# Altium footprint library 封装库.PcbLib: 755 footprints (part 35 of 48)
Each footprint in its own frame and in the unit in brackets; x right, y up, seen from the top. Pads: shape width x height; smd on the part's side, far side on the other; paste and mask are expansions set on the pad; w line width, h text height; cw(c..) or ccw(c..) is an arc to the next point about the centre after c.
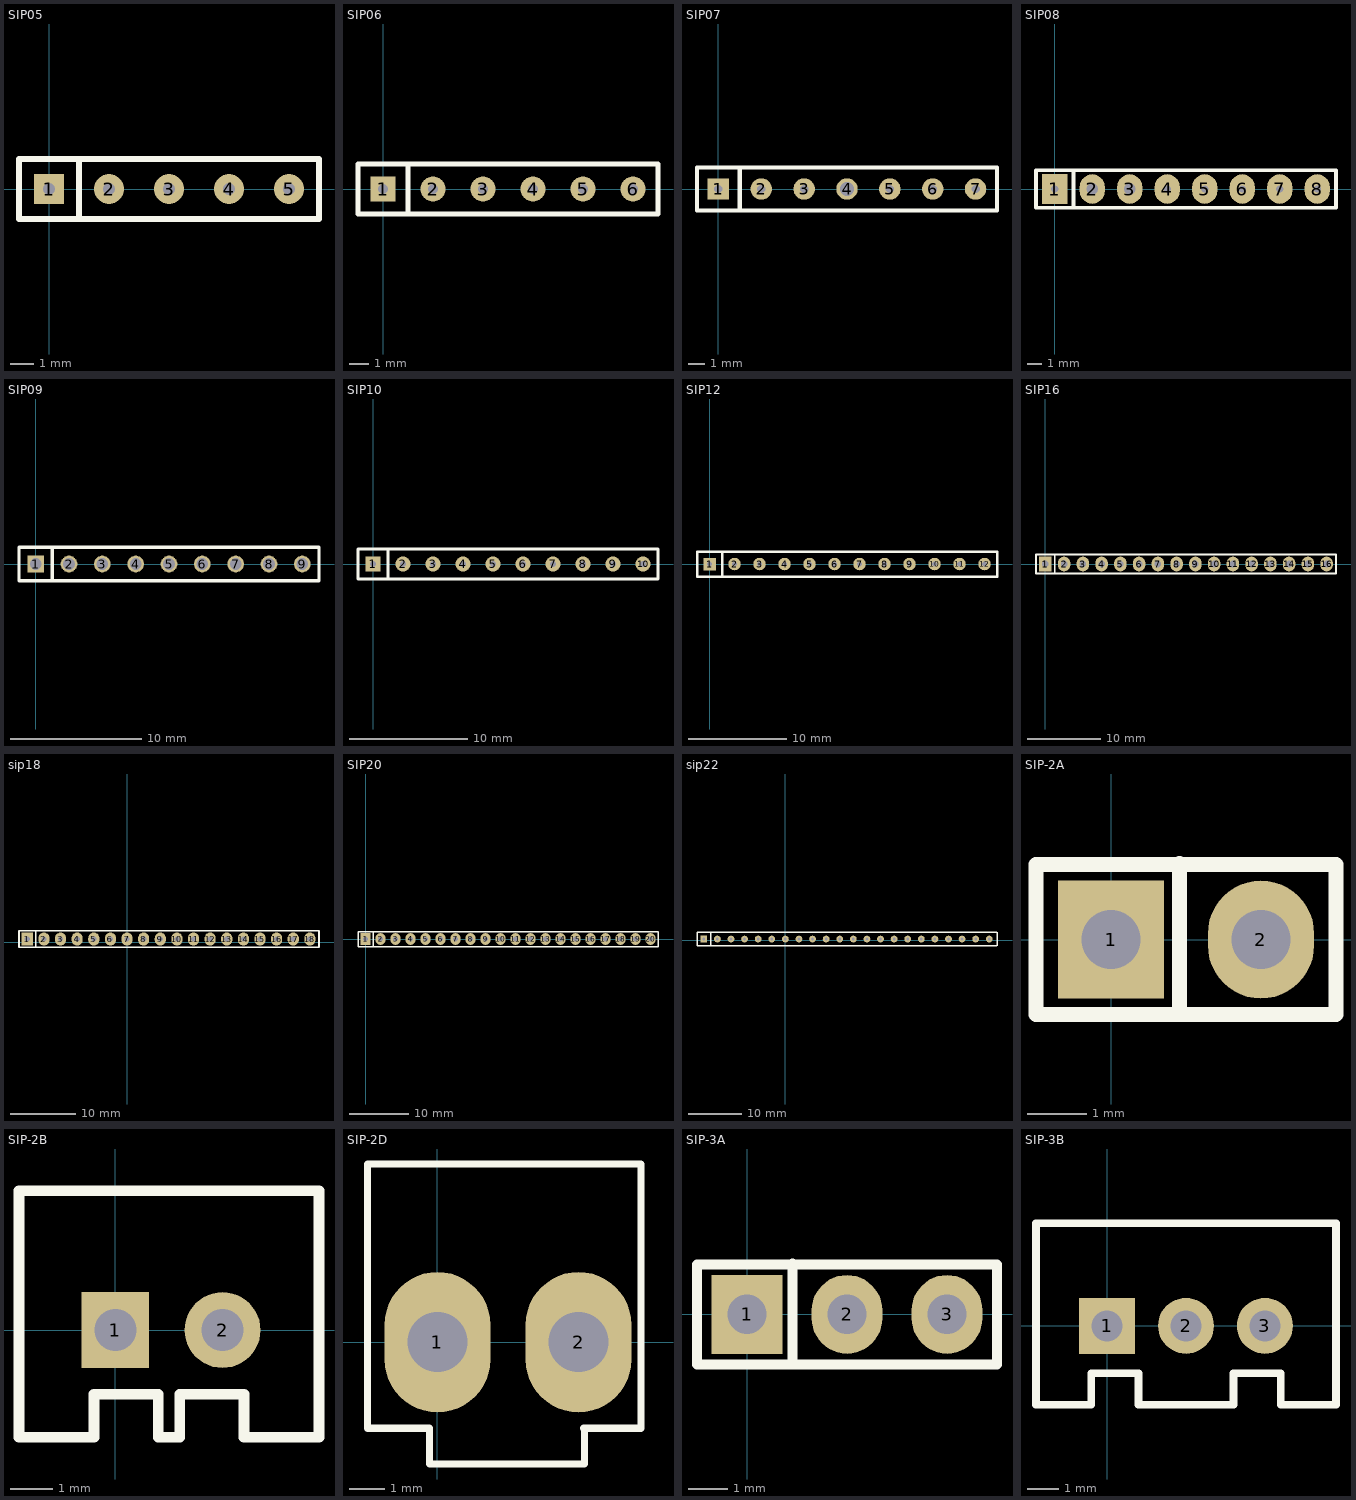
[diagram p34: the footprints below, top view; thin cyan lines are the x and y axes]

## SIP05 [mm]
pads (5):
  rect 1.27x1.27 hole 0.5: 1(0,0)
  round 1.27 hole 0.5: 2(2.54,0) 3(5.08,0) 4(7.62,0) 5(10.16,0)
Top Overlay:
  lines w0.254: 1.27,-1.27 1.27,1.27 ; -1.27,-1.27 -1.27,1.27 11.43,1.27 11.43,-1.27 -1.27,-1.27

## SIP06 [mm]
pads (6):
  rect 1.27x1.27 hole 0.5: 1(0,0)
  round 1.27 hole 0.5: 2(2.54,0) 3(5.08,0) 4(7.62,0) 5(10.16,0) 6(12.7,0)
Top Overlay:
  lines w0.254: 1.27,-1.27 1.27,1.27 ; -1.27,-1.27 -1.27,1.27 13.97,1.27 13.97,-1.27 -1.27,-1.27

## SIP07 [mm]
pads (7):
  rect 1.27x1.27 hole 0.5: 1(0,0)
  round 1.27 hole 0.5: 2(2.54,0) 3(5.08,0) 5(10.16,0) 6(12.7,0) 7(15.24,0)
  round 1.27 hole 0.813: 4(7.62,0)
Top Overlay:
  lines w0.254: 1.27,-1.27 1.27,1.27 ; -1.27,-1.27 -1.27,1.27 16.51,1.27 16.51,-1.27 -1.27,-1.27

## SIP08 [mm]
pads (8):
  rect 1.7x2 hole 0.5: 1(0,0)
  oval 1.7x2 hole 0.8: 2(2.54,0) 3(5.08,0)
  oval 1.7x2 hole 0.5: 4(7.62,0) 5(10.16,0) 6(12.7,0) 7(15.24,0) 8(17.78,0)
Top Overlay:
  lines w0.254: 1.27,-1.27 1.27,1.27 ; -1.27,-1.27 19.05,-1.27 19.05,1.27 -1.27,1.27 -1.27,-1.27

## SIP09 [mm]
pads (9):
  rect 1.27x1.27 hole 0.9: 1(0,0)
  round 1.27 hole 0.9: 2(2.54,0) 3(5.08,0) 4(7.62,0) 5(10.16,0) 6(12.7,0) 7(15.24,0) 8(17.78,0) 9(20.32,0)
Top Overlay:
  lines w0.254: 1.27,-1.27 1.27,1.27 ; -1.27,-1.27 -1.27,1.27 21.59,1.27 21.59,-1.27 -1.27,-1.27

## SIP10 [mm]
pads (10):
  rect 1.27x1.27 hole 0.5: 1(0,0)
  round 1.27 hole 0.5: 2(2.54,0) 3(5.08,0) 4(7.62,0) 5(10.16,0) 6(12.7,0) 7(15.24,0) 8(17.78,0) 9(20.32,0) 10(22.86,0)
Top Overlay:
  lines w0.254: 1.27,-1.27 1.27,1.27 ; -1.27,-1.27 -1.27,1.27 24.13,1.27 24.13,-1.27 -1.27,-1.27

## SIP12 [mm]
pads (12):
  rect 1.27x1.27 hole 0.5: 1(0,0)
  round 1.27 hole 0.5: 2(2.54,0) 3(5.08,0) 4(7.62,0) 5(10.16,0) 6(12.7,0) 7(15.24,0) 8(17.78,0) 9(20.32,0) 10(22.86,0) 11(25.4,0) 12(27.94,0)
Top Overlay:
  lines w0.254: 1.27,-1.27 1.27,1.27 ; -1.27,-1.27 29.21,-1.27 29.21,1.27 -1.27,1.27 -1.27,-1.27

## SIP16 [mm]
pads (16):
  rect 1.7x2 hole 0.9: 1(0,0)
  oval 1.7x2 hole 0.9: 2(2.54,0) 3(5.08,0) 4(7.62,0) 5(10.16,0) 6(12.7,0) 7(15.24,0) 8(17.78,0) 9(20.32,0) 10(22.86,0) 11(25.4,0) 12(27.94,0) 13(30.48,0) 14(33.02,0) 15(35.56,0) 16(38.1,0)
Top Overlay:
  lines w0.254: 1.27,-1.27 1.27,1.27 ; -1.27,-1.27 -1.27,1.27 39.37,1.27 39.37,-1.27 -1.27,-1.27

## sip18 [mm]
pads (18):
  rect 1.7x2 hole 0.8: 1(-15.24,0.508)
  oval 1.7x2 hole 0.8: 2(-12.7,0.508) 3(-10.16,0.508) 4(-7.62,0.508) 5(-5.08,0.508) 6(-2.54,0.508) 7(0,0.508) 8(2.54,0.508) 9(5.08,0.508) 10(7.62,0.508) 11(10.16,0.508) 12(12.7,0.508) 13(15.24,0.508) 14(17.78,0.508) 15(20.32,0.508) 16(22.86,0.508) 17(25.4,0.508) 18(27.94,0.508)
Top Overlay:
  lines w0.254: -13.97,-0.762 -13.97,1.778 ; 29.337,-0.762 -16.51,-0.762 -16.51,1.778 -16.485,1.803 29.337,1.803 29.337,-0.737

## SIP20 [mm]
pads (20):
  rect 1.7x2 hole 0.9: 1(0,0)
  oval 1.7x2 hole 0.9: 2(2.54,0) 3(5.08,0) 4(7.62,0) 5(10.16,0) 6(12.7,0) 7(15.24,0) 8(17.78,0) 9(20.32,0) 10(22.86,0) 11(25.4,0) 12(27.94,0) 13(30.48,0) 14(33.02,0) 15(35.56,0) 16(38.1,0) 17(40.64,0) 18(43.18,0) 19(45.72,0) 20(48.26,0)
Top Overlay:
  lines w0.254: 1.27,-1.27 1.27,1.27 ; -1.27,-1.27 -1.27,1.27 49.53,1.27 49.53,-1.27 -1.27,-1.27

## sip22 [mil]
pads (22):
  rect 50x50 hole 19.68: 1(-598,8)
  round 50 hole 19.68: 2(-498,8) 3(-398,8) 4(-298,8) 5(-198,8) 6(-98,8) 7(2,8) 8(102,8) 9(202,8) 10(302,8) 11(402,8) 12(502,8) 13(602,8) 14(702,8) 15(802,8) 16(902,8) 17(1002,8) 18(1102,8) 19(1202,8) 20(1302,8) 21(1402,8) 22(1502,8)
Top Overlay:
  lines w10: -548,-42 -548,58 ; 1558,-42 1352,-42 -648,-42 -648,58 1352,58 1558,58 ; 1559,-41 1559,59

## SIP-2A [mm]
pads (2):
  rect 1.8x2 hole 1: 1(0,0)
  oval 1.8x2 hole 1: 2(2.54,0)
Top Overlay:
  lines w0.254: 1.16,-1.25 1.16,1.29 ; -1.27,-1.27 3.81,-1.27 3.81,1.27 -1.27,1.27 -1.27,-1.27

## SIP-2B [mm]
pads (2):
  rect 1.6x1.8 hole 1: 1(0,0)
  round 1.8 hole 1: 2(2.54,0)
Top Overlay:
  lines w0.254: -2.286,-2.54 -0.508,-2.54 -0.508,-1.524 1.016,-1.524 1.016,-2.54 1.524,-2.54 1.524,-1.524 3.048,-1.524 3.048,-2.54 4.826,-2.54 4.826,3.302 -2.286,3.302 -2.286,-2.54

## SIP-2D [mil]
pads (2):
  oval 118x157 hole 67: 1(0,0) 2(157.48,0)
Top Overlay:
  lines w8: -78,199 -78,-96 -9,-96 -9,-136 164.08,-136 164.08,-96 ; -76,199 227.08,199 227.08,-96 163.08,-96

## SIP-3A [mm]
pads (3):
  rect 1.8x2 hole 1: 1(0,0)
  oval 1.8x2 hole 1: 2(2.54,0) 3(5.08,0)
Top Overlay:
  lines w0.254: 1.16,-1.25 1.16,1.29 ; -1.27,-1.27 -1.27,1.27 6.35,1.27 6.35,-1.27 -1.27,-1.27

## SIP-3B [mm]
pads (3):
  rect 1.8x1.8 hole 1: 1(0,0)
  round 1.8 hole 1: 2(2.54,0) 3(5.08,0)
Top Overlay:
  lines w0.254: -2.286,-2.54 -2.286,3.302 7.366,3.302 7.366,-2.54 5.588,-2.54 5.588,-1.524 4.064,-1.524 4.064,-2.54 1.016,-2.54 1.016,-1.524 -0.508,-1.524 -0.508,-2.54 -2.286,-2.54